# Altium footprint library PcbLib1.PcbLib: 44 footprints (part 1 of 3)
Each footprint in its own frame and in the unit in brackets; x right, y up, seen from the top. Pads: shape width x height; smd on the part's side, far side on the other; paste and mask are expansions set on the pad; w line width, h text height; cw(c..) or ccw(c..) is an arc to the next point about the centre after c.
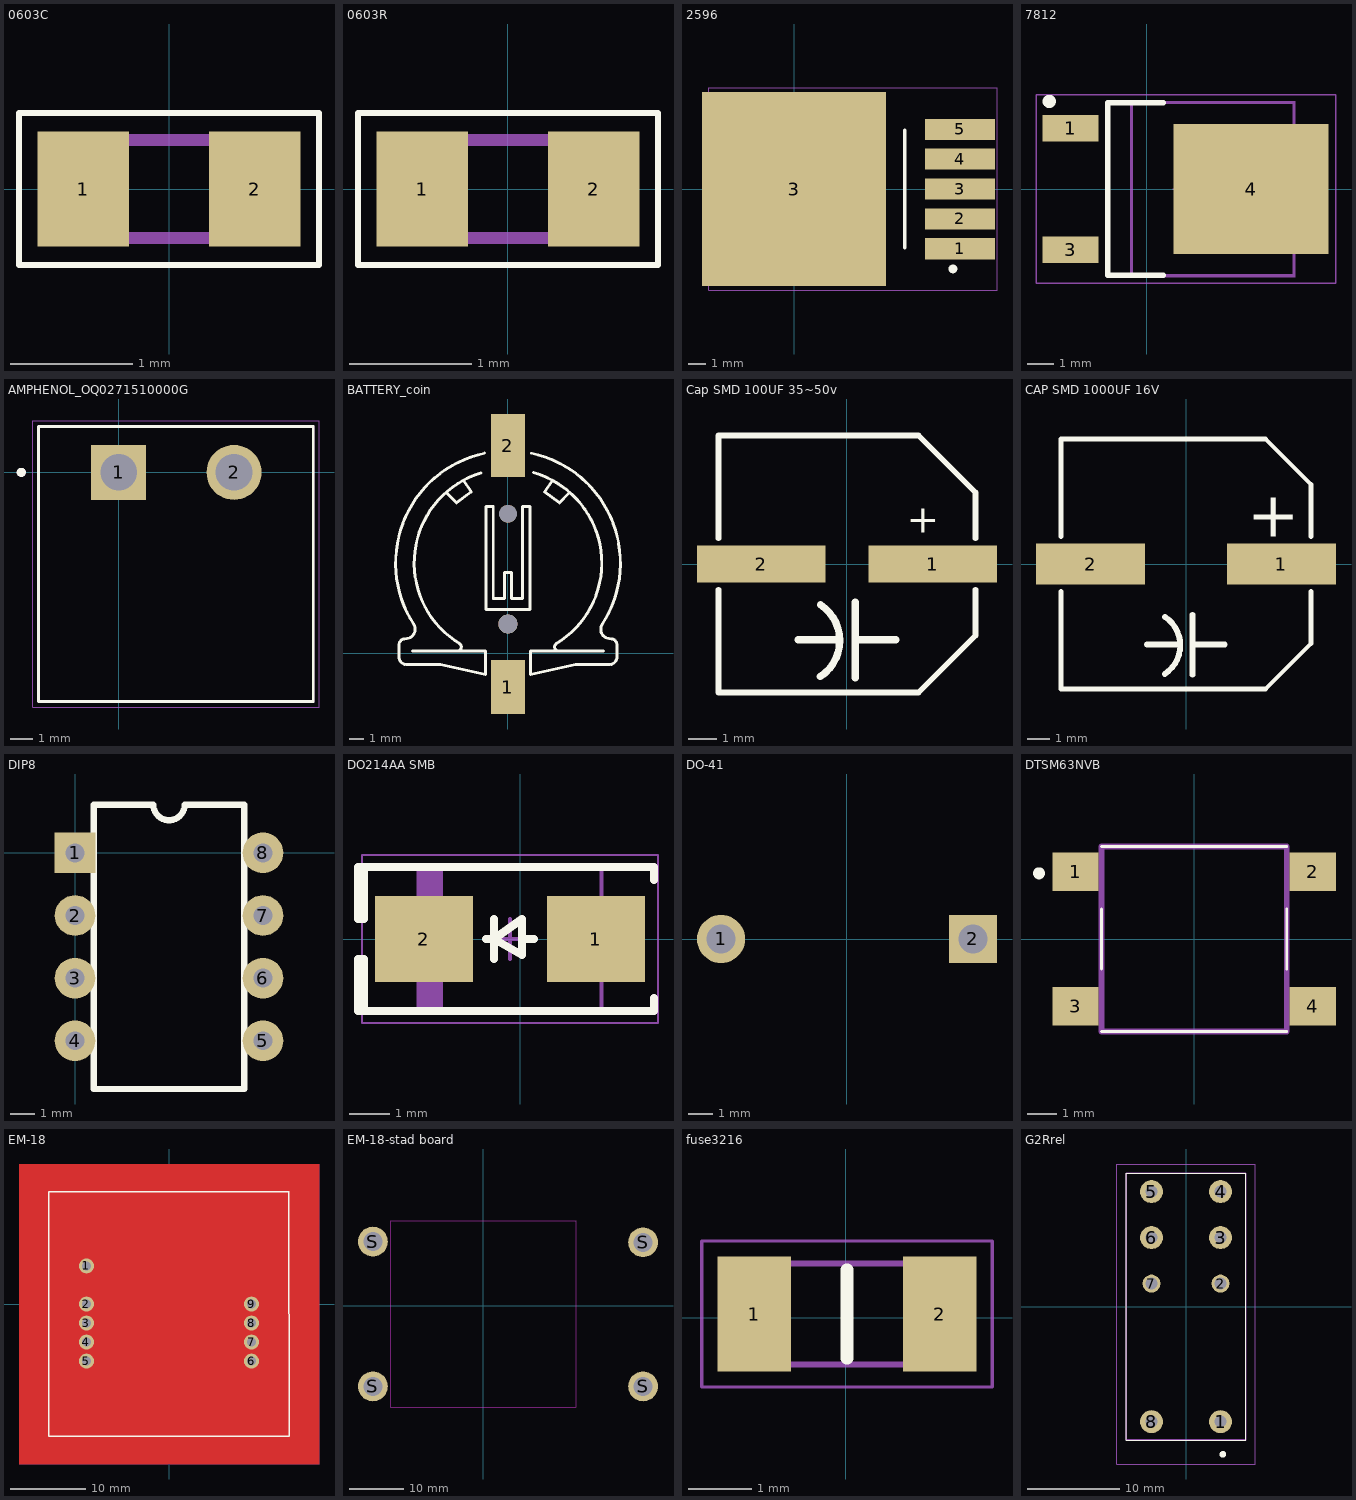
[diagram p0: the footprints below, top view; thin cyan lines are the x and y axes]

## 0603C [mm]
pads (2):
  rect 0.75x0.94 smd: 1(-0.7,0) 2(0.7,0)
Top Overlay:
  lines w0.05: -1.225,-0.62 -1.225,0.62 1.225,0.62 1.225,-0.62 -1.225,-0.62
Mechanical 13:
  lines w0.1: -0.8,-0.4 -0.8,0.4 0.8,0.4 0.8,-0.4 -0.8,-0.4
3D body "GRM188R11H471KA01D.stp": height 0.9, standoff 0, extent -0.8,-0.4 0.8,0.4

## 0603R [mm]
pads (2):
  rect 0.75x0.94 smd: 1(-0.7,0) 2(0.7,0)
Top Overlay:
  lines w0.05: -1.225,-0.62 1.225,-0.62 1.225,0.62 -1.225,0.62 -1.225,-0.62
Mechanical 13:
  lines w0.1: -0.8,-0.4 0.8,-0.4 0.8,0.4 -0.8,0.4 -0.8,-0.4
3D body "CRCW060356R0JNTA.stp": height 0.5, standoff 0, extent -0.787,-0.425 0.788,0.425

## 2596 [mm]
pads (6):
  rect 4x1.2 smd: 1(9.448,-3.4) 2(9.448,-1.7) 3(9.448,0) 4(9.448,1.7) 5(9.448,3.4)
  rect 10.5x11.05 smd: 3(0,0)
Top Overlay:
  circle w0.25: c9.048,-4.55 r0.125
  lines w0.2: 6.298,-3.35 6.298,3.35
Mechanical 13:
  lines w0.1: -1.102,-3.35 5.098,-3.35 5.098,3.35 -1.102,3.35 -1.102,-3.35
Mechanical 15:
  lines w0.05: -4.852,-5.775 11.557,-5.775 11.557,5.775 -4.852,5.775 -4.852,-5.775
  lines w0.1: 2.548,0 3.548,0 ; 3.048,-0.5 3.048,0.5
3D body "User Library-TO-263-5.STEP": height 4.56, standoff 0, extent -4.213,-5.08 9.801,5.08

## 7812 [mm]
pads (3):
  rect 2.1x1 smd: 1(-2.863,2.28) 3(-2.863,-2.28)
  rect 5.85x4.9 smd: 4(3.937,0)
Top Overlay:
  circle w0.25: c-3.663,3.3 r0.125
  lines w0.2: 0.637,-3.25 -1.463,-3.25 -1.463,3.25 0.637,3.25
Mechanical 13:
  lines w0.1: 5.549,-2.35 5.813,-2.35 6.35,-1.756 6.35,1.756 5.814,2.35 5.55,2.35 ; -0.55,-3.25 5.549,-3.25 5.549,3.25 -0.55,3.25 -0.55,-3.25
Mechanical 15:
  circle w0.05: c1.487,0 r0.35
  lines w0.001: -0.601,-3.3 5.599,-3.3 5.599,3.3 -0.601,3.3 -0.601,-3.3
  lines w0.05: 0.987,0 1.987,0 ; 1.487,-0.5 1.487,0.5 ; -4.163,-3.55 7.137,-3.55 7.137,3.55 -4.163,3.55 -4.163,-3.55
3D body "IRLR8743TRPBF.STEP": height 2.51, standoff 0, extent -3.466,-3.27 6.44,3.27

## AMPHENOL_OQ0271510000G [mm]
pads (2):
  rect 2.4x2.4 hole 1.6: 1(0,0)
  round 2.4 hole 1.6: 2(5.04,0)
Top Overlay:
  circle w0.2: c-4.25,0 r0.1
  lines w0.127: -3.5,-10 -3.5,2 8.5,2 8.5,-10 -3.5,-10
Mechanical 13:
  circle w0.2: c-4.25,0 r0.1
  lines w0.127: -3.5,-10 -3.5,2 8.5,2 8.5,-10 -3.5,-10
Mechanical 15:
  lines w0.05: -3.75,-10.25 -3.75,2.25 8.75,2.25 8.75,-10.25 -3.75,-10.25
3D body "2EDGR-5.08-02P-14-00AH.STEP": height 8.2, standoff -4, extent -2.667,-10.368 7.493,1.732
3D body "2EDGK-5.08-02P-14-00AH.STEP": height 15.1, standoff 0, extent -2.667,-18.924 7.493,-1.524

## BATTERY_coin [mm]
pads (4):
  rect 2.3x3.66 smd: 1(0,-2.295)
  rect 2.3x4.3 smd: 2(0,14.146)
  round 1.3 hole 1.3 unplated: ""(0,2)
  round 1.2 hole 1.2 unplated: ""(0,9.5)
Top Overlay:
  lines w0.2: -7.421,0.559 -7.421,-0.239 ccw(c-6.901,-0.239) -6.865,-0.758 ; -7.421,0.561 cw(c-6.993,0.569) -6.985,0.998 ; -6.978,0.997 ccw(c-6.967,1.644) -6.425,1.996 ; -6.863,-0.758 -4.588,-0.758 -1.522,-1.436 -1.522,0.16 -6.5,0.16 ; -6.414,1.979 cw(c0.001,6.145) -1.589,13.627 ; -4.125,10.887 -3.5,10.25 -2.5,11 -3,11.75 ; -3.512,0.162 ccw(c-3.458,0.438) -3.313,0.679 ; -3.274,0.656 cw(c0.029,6.153) -1.846,12.286 ; 1.602,13.624 cw(c0.013,6.151) 6.421,1.99 ; 1.746,12.303 cw(c-0.019,6.148) 3.28,0.659 ; 3,11.75 2.5,11 3.5,10.25 4.125,10.887 ; 3.313,0.679 ccw(c3.457,0.439) 3.501,0.163 ; 6.425,1.996 ccw(c6.967,1.644) 6.978,0.997 ; 6.5,0.16 1.522,0.16 1.522,-1.436 4.588,-0.758 6.863,-0.758 ; 6.865,-0.758 ccw(c6.901,-0.239) 7.421,-0.239 7.421,0.559 ; 6.985,0.998 cw(c6.993,0.569) 7.421,0.561 ; -1.5,3 1.5,3 1.5,10 1,10 1,3.75 0.25,3.75 0.25,5.5 -0.25,5.5 -0.25,3.75 -1,3.75 -1,10 -1.5,10 -1.5,3
3D body "User Library-s8411-45r_asm.STEP": height 4.35, standoff -0.9, extent -7.374,-3.315 7.374,15.886

## Cap SMD 100UF 35~50v [mm]
pads (2):
  rect 4.5x1.3 smd: 1(3,0) 2(-3,0)
Top Overlay:
  lines w0.2: -4.5,-0.9 -4.5,-4.5 2.5,-4.5 4.5,-2.5 4.5,-0.9 ; -4.5,0.9 -4.5,4.5 2.5,4.5 4.5,2.5 4.5,0.9
  lines w0.254: -1.715,-2.647 -0.365,-2.647 ; -0.935,-3.937 ccw(c-1.753,-2.68) -0.927,-1.427 ; 0.285,-3.977 0.285,-1.337 ; 0.365,-2.647 1.705,-2.647
  text "+" at 2.1,1.1 h1
3D body "User Library-FKF.STEP": height 10.02, standoff -0.02, extent -4.95,-4.15 4.95,4.15

## CAP SMD 1000UF 16V [mm]
pads (2):
  rect 4.8x1.8 smd: 1(4.2,0) 2(-4.2,0)
Top Overlay:
  lines w0.2: -5.5,-1.2 -5.5,-5.5 3.5,-5.5 5.5,-3.5 5.5,-1.2 ; -5.5,1.2 -5.5,5.5 3.5,5.5 5.5,3.5 5.5,1.2
  lines w0.254: -1.715,-3.547 -0.365,-3.547 ; -0.935,-4.837 ccw(c-1.753,-3.58) -0.927,-2.327 ; 0.285,-4.877 0.285,-2.237 ; 0.365,-3.547 1.705,-3.547
  text "+" at 2.7,1.2 h2
3D body "User Library-FKD.STEP": height 10.33, standoff 0.07, extent -5.75,-5.145 5.85,5.155

## DIP8 [mil]
pads (8):
  rect 65x65 hole 30: 1(0,0)
  round 65 hole 30: 2(0,-100) 3(0,-200) 4(0,-300) 5(300,-300) 6(300,-200) 7(300,-100) 8(300,0)
Top Overlay:
  lines w10: 30,-377 270,-377 270,77 175,77 cw(c150,77) 125,77 30,77 30,-377
3D body "SW3DPS-DIP8-DEFAULT.step": height 165, standoff -105, extent -5,-375 305,75

## DO214AA SMB [mm]
pads (2):
  rect 2.45x2.15 smd: 1(1.896,0) 2(-2.404,0)
Top Overlay:
  lines w0.2: -3.904,-1.8 -3.904,-0.5 -4.054,-0.5 -4.054,-1.8 3.346,-1.8 3.346,-1.475 ; -3.904,1.8 -3.904,0.5 -4.054,0.5 -4.054,1.8 3.346,1.8 3.346,1.475 ; -0.854,0 -0.654,0 ; -0.654,-0.5 -0.654,0.5 ; 0.046,0 0.346,0 ; -0.654,0 0.046,-0.4 0.046,0.5 -0.654,0
Mechanical 13:
  region: -1.924,1.8 -2.539,1.8 -2.539,-1.8 -1.924,-1.8
  lines w0.1: -2.539,-1.8 2.031,-1.8 2.031,1.8 -2.539,1.8 -2.539,-1.8
Mechanical 15:
  lines w0.05: -3.954,-2.1 3.446,-2.1 3.446,2.1 -3.954,2.1 -3.954,-2.1
  lines w0.1: -0.754,0 0.246,0 ; -0.254,-0.5 -0.254,0.5
3D body "SMB.STEP": height 2.4, standoff 0, extent -2.854,-1.8 2.346,1.799

## DO-41 [mm]
pads (2):
  round 2 hole 1.2: 1(-5.23,0)
  rect 2x2 hole 1.2: 2(5.23,0)
Bottom Overlay:
  rectangle: 1.95,-1.4 2.75,1.4
  lines w0.2: 2.65,-1.4 -2.65,-1.4 -2.65,1.4 2.65,1.4

## DTSM63NVB [mm]
pads (4):
  rect 1.55x1.3 smd: 1(-3.975,2.25) 2(3.975,2.25) 3(-3.975,-2.25) 4(3.975,-2.25)
Top Overlay:
  lines w0.1: -3.1,-3.1 3.1,-3.1 ; -3.1,-1 -3.1,1 ; -3.1,3.1 3.1,3.1 ; 3.1,-1 3.1,1
  lines w0.2: -5.2,2.1 ccw(c-5.2,2.2) -5.2,2.3 ccw(c-5.2,2.2) -5.2,2.1
Mechanical 13:
  lines w0.2: -3.1,-3.1 -3.1,3.1 3.1,3.1 3.1,-3.1 -3.1,-3.1
3D body "Tactal Switch - SMD 6x6x5.stp": height -0.4, standoff -5.4, extent -4.445,-3.016 4.572,3.016

## EM-18 [mm]
pads (9):
  round 2 hole 1.2 mask+0.05: 1(-11,5.08) 2(-11,0) 3(-11,-2.54) 4(-11,-5.08) 5(-11,-7.62) 6(11,-7.62) 7(11,-5.08) 8(11,-2.54) 9(11,0)
Top Layer:
  pour cut-out: -20,18.669 20,18.669 20,-21.331 -20,-21.331
Bottom Layer:
  pour cut-out: -20,18.669 20,18.669 20,-21.331 -20,-21.331
Top Overlay:
  lines w0.2: -16,-17.62 -16,15 16,15 16,-17.62 -16,-17.62
3D body "User Library-EM-18.step": height 8.05, standoff -6.1, extent -16.49,-18.024 16.51,14.976

## EM-18-stad board [mm]
pads (4):
  round 5.5 hole 3.5: S(-20.32,-14.859) S(-20.32,11.811) S(29.464,-14.859) S(29.464,11.684)
Keep-Out Layer:
  lines w0.1: -17.018,-18.669 17.018,-18.669 17.018,15.621 -17.018,15.621 -17.018,-18.669
3D body "em18_stand.step": height 0.05, standoff -16.66, extent -23.496,-18.161 32.639,14.986

## fuse3216 [mm]
pads (2):
  rect 1.17x1.82 smd: 1(-1.451,0.056) 2(1.489,0.056)
Top Overlay:
  lines w0.2: 0.019,-0.644 0.019,0.756
Mechanical 13:
  lines w0.1: -1.581,-0.744 1.619,-0.744 1.619,0.856 -1.581,0.856 -1.581,-0.744
Mechanical 15:
  lines w0.05: -2.286,-1.104 2.324,-1.104 2.324,1.216 -2.286,1.216 -2.286,-1.104
3D body "1206SFS200F_63-2.stp": height 1.17, standoff 0, extent -1.581,-0.744 1.619,0.856

## G2Rrel [mm]
pads (8):
  round 2.5 hole 1.3: 1(3.75,-12.5) 3(3.75,7.5) 4(3.75,12.5) 5(-3.75,12.5) 6(-3.75,7.5) 8(-3.75,-12.5)
  round 1.95 hole 1.3: 2(3.75,2.5) 7(-3.75,2.5)
Top Overlay:
  lines w0.1: -6.5,-14.5 6.5,-14.5 6.5,14.5 -6.5,14.5 -6.5,-14.5
  lines w0.6: 4,-16.1 ccw(c4,-16.05) 4,-16 ccw(c4,-16.05) 4,-16.1
Mechanical 13:
  lines w0.2: -6.5,-14.5 6.5,-14.5 6.5,14.5 -6.5,14.5 -6.5,-14.5
Mechanical 15:
  lines w0.1: -7.5,-17.1 7.5,-17.1 7.5,15.5 -7.5,15.5 -7.5,-17.1
3D body "g2r-2z-2h_l29_w13_h25-5.stp": height 25.5, standoff -4, extent -6.5,-14.5 6.5,14.5